# Altium footprint library Binh.PcbLib: 863 footprints (part 22 of 54)
Each footprint in its own frame and in the unit in brackets; x right, y up, seen from the top. Pads: shape width x height; smd on the part's side, far side on the other; paste and mask are expansions set on the pad; w line width, h text height; cw(c..) or ccw(c..) is an arc to the next point about the centre after c.
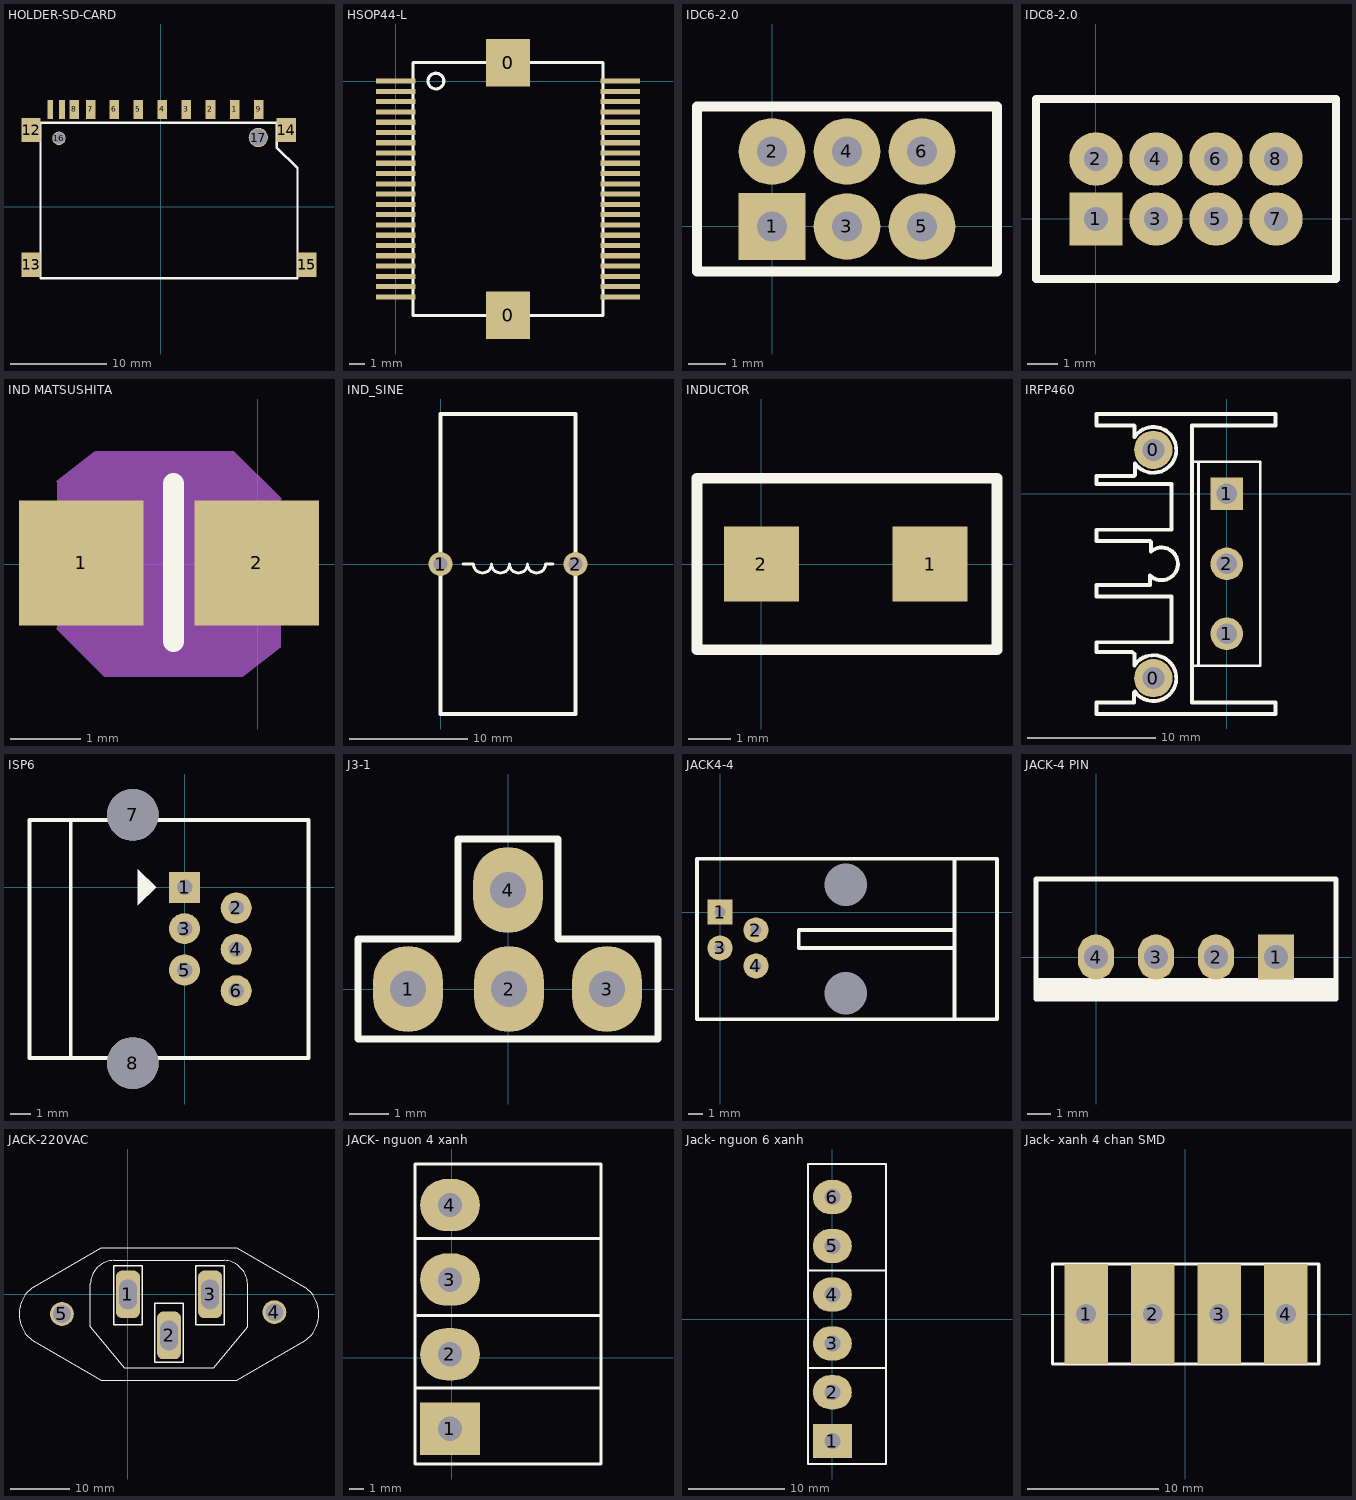
[diagram p21: the footprints below, top view; thin cyan lines are the x and y axes]

## HOLDER-SD-CARD [mm]
pads (17):
  rect 1x2 smd: 1(7.67,10.109) 2(5.17,10.109) 3(2.67,10.109) 4(0.17,10.109) 5(-2.33,10.109) 6(-4.83,10.109) 7(-7.255,10.109) 8(-8.955,10.109) 9(10.17,10.109)
  rect 0.6x2 smd: 10(-10.255,10.109) 11(-11.455,10.109)
  rect 2x2.5 smd: 12(-13.455,7.95) 13(-13.455,-6.02) 14(13.024,7.95) 15(15.183,-6.02)
  round 1.4 hole 1.2: 16(-10.555,7.109)
  round 2 hole 1.8: 17(10.135,7.188)
Top Overlay:
  lines w0.254: -12.471,-7.417 14.199,-7.417 14.199,4.013 12.04,6.172 12.04,8.712 -12.471,8.712 -12.471,-7.417
3D body "User Library-SD Kart.step": height 3, standoff -1, extent -13.436,-20.196 15.164,9.804

## HSOP44-L [mm]
pads (46):
  rect 2.8x3 smd: 0(7.1,-14.815) 0(7.1,1.162)
  rect 2.5x0.325 smd: 1(0,0) 2(0,-0.65) 3(0,-1.3) 4(0,-1.95) 5(0,-2.6) 6(0,-3.25) 7(0,-3.9) 8(0,-4.55) 9(0,-5.2) 10(0,-5.85) 11(0,-6.5) 12(0,-7.15) 13(0,-7.8) 14(0,-8.45) 15(0,-9.1) 16(0,-9.75) 17(0,-10.4) 18(0,-11.05) 19(0,-11.7) 20(0,-12.35) 21(0,-13) 22(0,-13.65) 23(14.2,-13.65) 24(14.2,-13) 25(14.2,-12.35) 26(14.2,-11.7) 27(14.2,-11.05) 28(14.2,-10.4) 29(14.2,-9.75) 30(14.2,-9.1) 31(14.2,-8.45) 32(14.2,-7.8) 33(14.2,-7.15) 34(14.2,-6.5) 35(14.2,-5.85) 36(14.2,-5.2) 37(14.2,-4.55) 38(14.2,-3.9) 39(14.2,-3.25) 40(14.2,-2.6) 41(14.2,-1.95) 42(14.2,-1.3) 43(14.2,-0.65) 44(14.2,0)
Top Overlay:
  circle w0.2: c2.54,0 r0.5
  lines w0.2: 1.1,-14.825 13.1,-14.825 13.1,1.175 1.1,1.175 1.1,-14.825

## IDC6-2.0 [mil]
pads (6):
  rect 70x70 hole 32 unplated: 1(0,0)
  round 70 hole 32 unplated: 2(0,78.74) 3(78.74,0) 4(78.74,78.74) 5(157.48,0) 6(157.48,78.74)
Top Overlay:
  lines w10: -78.74,-47.24 -78.74,125.98 236.22,125.98 236.22,-47.24 -78.74,-47.24

## IDC8-2.0 [mil]
pads (8):
  rect 70x70 hole 32 unplated: 1(0,0)
  round 70 hole 32 unplated: 2(0,78.74) 3(78.74,0) 4(78.74,78.74) 5(157.48,0) 6(157.48,78.74) 7(236.22,0) 8(236.22,78.74)
Top Overlay:
  lines w10: -78.74,-78.74 -78.74,0 -78.74,157.48 314.96,157.48 314.96,-78.74 -78.74,-78.74

## IND MATSUSHITA [mil]
pads (2):
  rect 70x70 smd: 1(-98.98,0.79) 2(-0.55,0.79)
Top Overlay:
  lines w11.81: -47.24,-43.31 -47.24,45.28
Mechanical 2:
  region: -8.52,-63.37 13.23,-46.45 1.14,-30.91 -20.61,-47.83
  region: -101.04,31.12 -79.29,48.04 -91.38,63.58 -113.13,46.66
  region: -86.18,-63.15 13.72,36.75 -13.35,63.81 -113.25,-36.09
  rectangle: -91.1,-2.13 -13.35,63.61
  rectangle: -86.18,-63.18 -8.42,2.55
  rectangle: -112.75,-36.61 -86.18,46.66
  rectangle: -34.01,-46.45 13.23,36.23
Mechanical 6:
  lines w1.97: -86.77,10.63 13.23,10.63 ; 5.36,8 13.23,10.63 ; 5.36,13.25 13.23,10.63 ; 13.23,8.66 13.23,12.6

## IND_SINE [mil]
pads (2):
  round 80 hole 47.24: 1(0,0) 2(450,0)
Top Overlay:
  lines w10: 75,0 110,0 ccw(c140,0) 170,0 ccw(c200,0) 230,0 ccw(c260,0) 290,0 ccw(c320,0) 350,0 375,0
  lines w12: 0,-500 0,0 0,500 450,500 450,-500 0,-500

## INDUCTOR [mil]
pads (2):
  rect 70x70 smd: 1(157.48,0) 2(0,0)
Top Overlay:
  lines w10: -60,-80 -60,80 220,80 220,-80 -60,-80

## IRFP460 [mm]
pads (5):
  round 3 hole 1.7: 0(-5.715,-14.351) 0(-5.715,3.429)
  round 2.54 hole 1.6: 1(0,-10.9) 2(0,-5.45)
  rect 2.54x2.54 hole 1.6: 1(0,0)
Top Overlay:
  lines w0.2: -2.2,-13.4 -2.2,2.5 ; -2.7,-13.4 -2.7,2.5 2.6,2.5 2.6,-13.4 -2.7,-13.4
  lines w0.305: -2.7,2.159 -2.7,5.334 3.81,5.334 3.81,6.223 -10.16,6.223 -10.16,5.334 -7.239,5.334 -7.198,5.293 -7.198,4.418 cw(c-5.715,3.429) -7.157,2.381 -7.157,1.479 -7.239,1.397 -8.382,1.397 -10.16,1.397 -10.16,0.762 -4.318,0.762 -4.318,-2.794 -10.16,-2.794 -10.16,-3.683 -5.969,-3.683 -5.9,-3.752 -5.9,-4.48 cw(c-5.08,-5.45) -5.972,-6.354 -5.972,-7.109 -5.969,-7.112 -10.16,-7.112 -10.16,-8.001 -4.318,-8.001 -4.318,-11.557 -10.16,-11.557 -10.16,-12.319 -7.366,-12.319 -7.198,-12.487 -7.198,-13.362 cw(c-5.715,-14.351) -7.157,-15.399 -7.239,-15.482 -7.239,-16.256 -10.16,-16.256 -10.16,-17.145 3.81,-17.145 3.81,-16.256 -2.7,-16.256 -2.7,3.048

## ISP6 [mil] "Jac nap PIC"
pads (8):
  rect 60x60 hole 30: 1(0,0)
  round 60 hole 30: 2(100,-40) 3(0,-80) 4(100,-120) 5(0,-160) 6(100,-200)
  round 100 hole 100: 7(-100,140) 8(-100,-340)
Top Overlay:
  region: -55,0 -90,35 -90,-35
  lines w7: -220,-330 -220,130
  lines w8: -300,-330 240,-330 240,130 -300,130 -300,-330

## J3-1 [mil] "Jumper 4"
height 200
pads (4):
  oval 70x86 hole 36: 1(-100,0) 2(1,0) 3(99,0) 4(0,99)
Top Overlay:
  lines w7: -150,-50 150,-50 150,50 50,50 50,150 -50,150 -50,50 -150,50 -150,-50

## JACK4-4 [mil]
pads (6):
  rect 70x70 hole 31.5 unplated: 1(0,0)
  round 70 hole 31.5 unplated: 2(100,-50) 3(0,-100) 4(100,-150)
  round 70 hole 118.11 unplated: ""(350,-225.98) ""(350,75.98)
Top Overlay:
  lines w10: 651.97,-297.64 651.97,-98 ; 651.97,-97 651.97,-50 219,-50 219,-100 651.97,-100 651.97,-86 ; 651.97,-54 651.97,147.64 ; -64,-297.64 -64,147.64 770.08,147.64 770.08,-297.64 -64,-297.64

## JACK-4 PIN [mil] "Jac connect 4pin"
pads (4):
  rect 60x75 hole 40: 1(300,0)
  oval 60x75 hole 40: 2(200,0) 3(100,0) 4(0,0)
Top Overlay:
  rectangle: -100,-70 400,-35
  lines w7.87: -100,-70 400,-70 400,130 -100,130 -100,-70

## JACK-220VAC [mm]
pads (5):
  rrect50% 4x8 hole 3 slot 5 at 90 deg: 1(0,0) 2(6.903,-6.903) 3(13.807,0)
  round 4 hole 3: 4(24.612,-3.001) 5(-11.105,-3.302)
Top Overlay:
  lines w0.2: -15.923,-7.804 -4.486,-14.407 ; -15.923,1.201 -4.486,7.804 ; -15.908,-7.804 cw(c-12.887,-3.302) -15.908,1.201 ; -4.502,-14.407 18.309,-14.407 ; -4.502,7.804 18.309,7.804 ; 18.293,-14.406 29.73,-7.803 ; 18.293,7.804 29.73,1.201 ; 29.714,-7.804 ccw(c26.694,-3.302) 29.714,1.201 ; -6.303,-5.403 -0.6,-12.306 14.407,-12.306 20.11,-5.403 20.11,1.801 ccw(c15.997,1.59) 16.208,5.703 -2.401,5.703 ccw(c-2.251,1.651) -6.303,1.801 -6.303,-5.403
  lines w0.254: -2.401,-5.102 -2.401,4.802 2.401,4.802 2.401,-5.102 -2.401,-5.102 ; 4.502,-11.405 4.502,-1.501 9.304,-1.501 9.304,-11.405 4.502,-11.405 ; 11.405,-5.102 11.405,4.802 16.208,4.802 16.208,-5.102 11.405,-5.102

## JACK- nguon 4 xanh [mil] "Cau dau nguon xanh"
pads (4):
  rect 160x140 hole 65: 1(-5,-190)
  oval 160x140 hole 65: 2(-5,10) 3(-5,210) 4(-5,410)
Top Overlay:
  lines w8: -98.66,520 -98.66,-284.25 400,-284.25 400,519.75 -97.66,519.75 ; -97.66,-80.25 400,-80.25 ; -97.66,319.75 395,319.75 ; -91.66,113.75 400,113.75

## Jack- nguon 6 xanh [mil] "Cau dau nguon xanh"
pads (6):
  rect 160x140 hole 65: 1(0,-500)
  oval 160x140 hole 65: 2(0,-300) 3(0,-100) 4(0,100) 5(0,300) 6(0,500)
Top Overlay:
  lines w8: -100,-200.25 215,-200.25 ; -100,200 215,199.75 ; -100,-594.25 220,-594.25 220,635.75 -100,635.75 -100,-594.25

## Jack- xanh 4 chan SMD [mil] "Jac xanh duc"
pads (4):
  rect 130x300 hole 59.05: 1(-297.27,0) 2(-97.73,0) 3(101.82,0) 4(301.36,0)
Top Overlay:
  lines w10: -397.73,-150 -397.73,150 400,150 400,-150 -397.73,-150